# Altium schematic symbol library Sang_library.SchLib: 1607 symbols (part 6 of 15) (continued)
## EP2C35-BGA484 (continued)
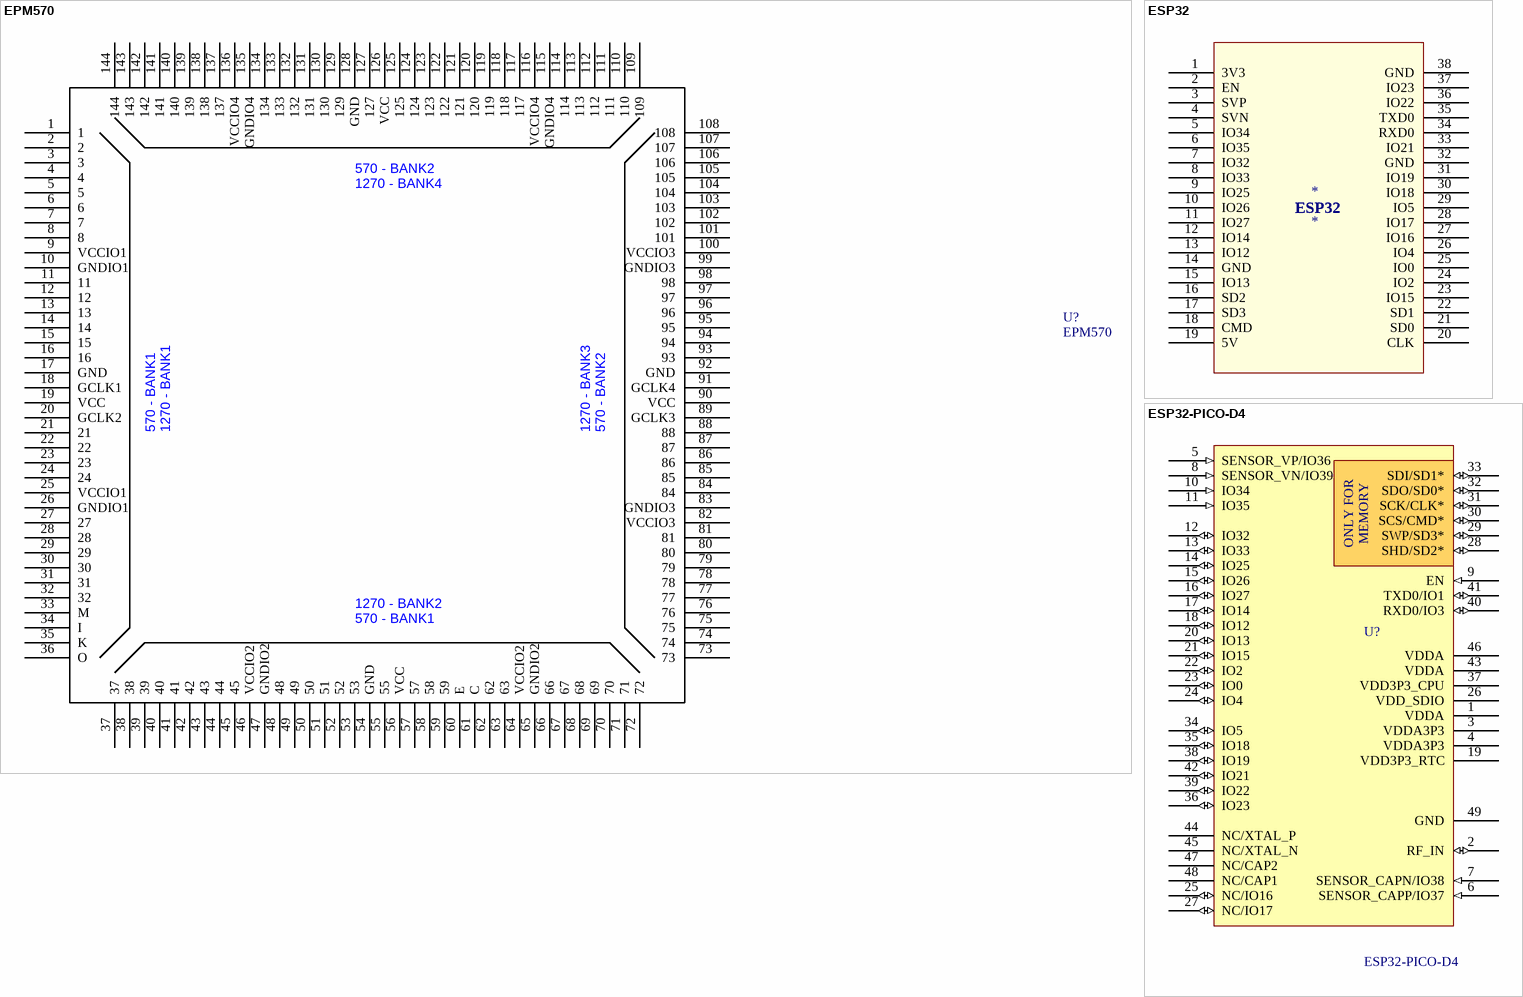
[diagram p38: symbols EPM570 to ESP32-PICO-D4]

## EPM570
designator U?
ALTERA EPLD; Manufacturer Part Number: EPM570T144C5N; Number of Logic Blocks/Elements: 570; Programmable Type: In System Programmable; Delay Time tpd(1) Max: 5.4nS; Voltage: 2.5V, 3.3V; Number of I /O: 116; Memory Type: FLASH; Number of Macrocells: 440; Supplier 1: Digi-Key; Supplier Part Number 1: 544-1320-ND; Operating Temperature: 0°C ~ 85°C; Packaging: Tray; Package / Case: 144-TQFP, 144-VQFP; RoHS: RoHS Compliant; Supplier: Digi-Key; Features: -; Supplier Part Number: 544-1320-ND; Manufacturer: Altera; Category: Integrated Circuits (ICs)
footprint TQFP144
pins: 1, 2, 3, 4, 5, 6, 7, 8, 9 VCCIO1, 10 GNDIO1, 11, 12, 13, 14, 15, 16, 17 GND, 18 GCLK1, 19 VCC, 20 GCLK2, 21, 22, 23, 24, 25 VCCIO1, 26 GNDIO1, 27, 28, 29, 30, 31, 32, 33 M, 34 I, 35 K, 36 O, 37, 38, 39, 40, 41, 42, 43, 44, 45, 46 VCCIO2, 47 GNDIO2, 48, 49, 50, 51, 52, 53, 54 GND, 55, 56 VCC, 57, 58, 59, 60 E, 61 C, 62, 63, 64 VCCIO2, 65 GNDIO2, 66, 67, 68, 69, 70, 71, 72, 73, 74, 75, 76, 77, 78, 79, 80, 81, 82 VCCIO3, 83 GNDIO3, 84, 85, 86, 87, 88, 89 GCLK3, 90 VCC, 91 GCLK4, 92 GND, 93, 94, 95, 96, 97, 98, 99 GNDIO3, 100 VCCIO3, 101, 102, 103, 104, 105, 106, 107, 108, 109, 110, 111, 112, 113, 114, 115 GNDIO4, 116 VCCIO4, 117, 118, 119, 120, 121, 122, 123, 124, 125, 126 VCC, 127, 128 GND, 129, 130, 131, 132, 133, 134, 135 GNDIO4, 136 VCCIO4, 137, 138, 139, 140, 141, 142, 143, 144
text: 570 - BANK2; 1270 - BANK4; 570 - BANK1; 1270 - BANK1; 1270 - BANK3; 1270 - BANK2

## ESP32
designator *
footprint ESP32
pins: 1 3V3, 2 EN, 3 SVP, 4 SVN, 5 IO34, 6 IO35, 7 IO32, 8 IO33, 9 IO25, 10 IO26, 11 IO27, 12 IO14, 13 IO12, 14 GND, 15 IO13, 16 SD2, 17 SD3, 18 CMD, 19 5V, 20 CLK, 21 SD0, 22 SD1, 23 IO15, 24 IO2, 25 IO0, 26 IO4, 27 IO16, 28 IO17, 29 IO5, 30 IO18, 31 IO19, 32 GND, 33 IO21, 34 RXD0, 35 TXD0, 36 IO22, 37 IO23, 38 GND

## ESP32-PICO-D4
designator U?
ESP32 WIFI BLUETOOTH; MFR: Espressif; Solder: SMT; Category: MODULE; MPN: ESP32-PICO-D4; PinCount: 48; Value: ESP32-PICO-D4
footprint ESP32-PICO-D4 (Footprint not found)
pins: 1 VDDA (power) "Power supply", 2 RF_IN (io) "Power supply", 3 VDDA3P3 (power) "Power supply", 4 VDDA3P3 (power) "Power supply", 5 SENSOR_VP/IO36 (in) "GPIO36, ADC1_CH0, RTC_GPIO0", 6 SENSOR_CAPP/IO37 (in) "GPIO39, ADC1_CH3, RTC_GPIO3", 7 SENSOR_CAPN/IO38 (in) "GPIO39, ADC1_CH3, RTC_GPIO3", 8 SENSOR_VN/IO39 (in) "GPIO39, ADC1_CH3, RTC_GPIO3", 9 EN (in) "Module-enable signal. Active high.", 10 IO34 (in) "GPIO34, ADC1_CH6, RTC_GPIO4", 11 IO35 (in) "GPIO35, ADC1_CH7, RTC_GPIO5", 12 IO32 (io) "GPIO32, XTAL_32K_P, ADC1_CH4, TOUCH9, RTC_GPIO9", 13 IO33 (io) "GPIO33, XTAL_32K_N, ADC1_CH5,TOUCH8, RTC_GPIO8", 14 IO25 (io) "GPIO25, DAC_1, ADC2_CH8, RTC_GPIO6, EMAC_RXD0", 15 IO26 (io) "GPIO26, DAC_2, ADC2_CH9, RTC_GPIO7, EMAC_RXD1", 16 IO27 (io) "GPIO27, ADC2_CH7, TOUCH7, RTC_GPIO17, EMAC_RX_DV", 17 IO14 (io) "GPIO14, ADC2_CH6, TOUCH6, RTC_GPIO16, MTMS, HSPICLK, HS2_CLK, SD_CLK, EMAC_TXD2", 18 IO12 (io) "GPIO12, ADC2_CH5, TOUCH5, RTC_GPIO15, MTDI, HSPIQ, HS2_DATA2, SD_DATA2, EMAC_TXD3", 19 VDD3P3_RTC (power) "Power supply", 20 IO13 (io) "GPIO13, ADC2_CH4, TOUCH4, RTC_GPIO14, MTCK, HSPID, HS2_DATA3,SD_DATA3, EMAC_RX_ER", 21 IO15 (io) "GPIO15, ADC2_CH3, TOUCH3, MTDO, HSPICS0, RTC_GPIO13, HS2_CMD,SD_CMD, EMAC_RXD3", 22 IO2 (io) "GPIO2, ADC2_CH2, TOUCH2, RTC_GPIO12, HSPIWP, HS2_DATA0,SD_DATA0", 23 IO0 (io) "GPIO0, ADC2_CH1, TOUCH1, RTC_GPIO11, CLK_OUT1, EMAC_TX_CLK", 24 IO4 (io) "GPIO4, ADC2_CH0, TOUCH0, RTC_GPIO10, HSPIHD, HS2_DATA1,SD_DATA1, EMAC_TX_ER", 25 NC/IO16 (io) "GPIO4, ADC2_CH0, TOUCH0, RTC_GPIO10, HSPIHD, HS2_DATA1,SD_DATA1, EMAC_TX_ER", 26 VDD_SDIO (power) "Power supply", 27 NC/IO17 (io) "GPIO16, HS1_DATA4, U2RXD, EMAC_CLK_OUT", 28 SHD/SD2* (io) "GPIO9, SD_DATA2, SPIHD, HS1_DATA2, U1RXD", 29 SWP/SD3* (io) "GPIO10, SD_DATA3, SPIWP, HS1_DATA3, U1TXD", 30 SCS/CMD* (io) "GPIO11, SD_CMD, SPICS0, HS1_CMD, U1RTS", 31 SCK/CLK* (io) "GPIO6, SD_CLK, SPICLK, HS1_CLK, U1CTS", 32 SDO/SD0* (io) "GPIO7, SD_DATA0, SPIQ, HS1_DATA0, U2RTS", 33 SDI/SD1* (io) "GPIO8, SD_DATA1, SPID, HS1_DATA1, U2CTS", 34 IO5 (io) "GPIO5, VSPICS0, HS1_DATA6, EMAC_RX_CLK", 35 IO18 (io) "GPIO18, VSPICLK, HS1_DATA7", 36 IO23 (io) "GPIO23, VSPID, HS1_STROBE", 37 VDD3P3_CPU (power) "NC", 38 IO19 (io) "GPIO19, VSPIQ, U0CTS, EMAC_TXD0", 39 IO22 (io) "GPIO22, VSPIWP, U0RTS, EMAC_TXD1", 40 RXD0/IO3 (io) "GPIO3, U0RXD, CLK_OUT2", 41 TXD0/IO1 (io) "GPIO1, U0TXD, CLK_OUT3, EMAC_RXD2", 42 IO21 (io) "GPIO21, VSPIHD, EMAC_TX_EN", 43 VDDA (power) "NC", 44 NC/XTAL_P "GPIO23, VSPID, HS1_STROBE", 45 NC/XTAL_N "GPIO23, VSPID, HS1_STROBE", 46 VDDA (power) "NC", 47 NC/CAP2 "GPIO23, VSPID, HS1_STROBE", 48 NC/CAP1 "GPIO23, VSPID, HS1_STROBE", 49 GND (power)
text: ONLY FOR; MEMORY

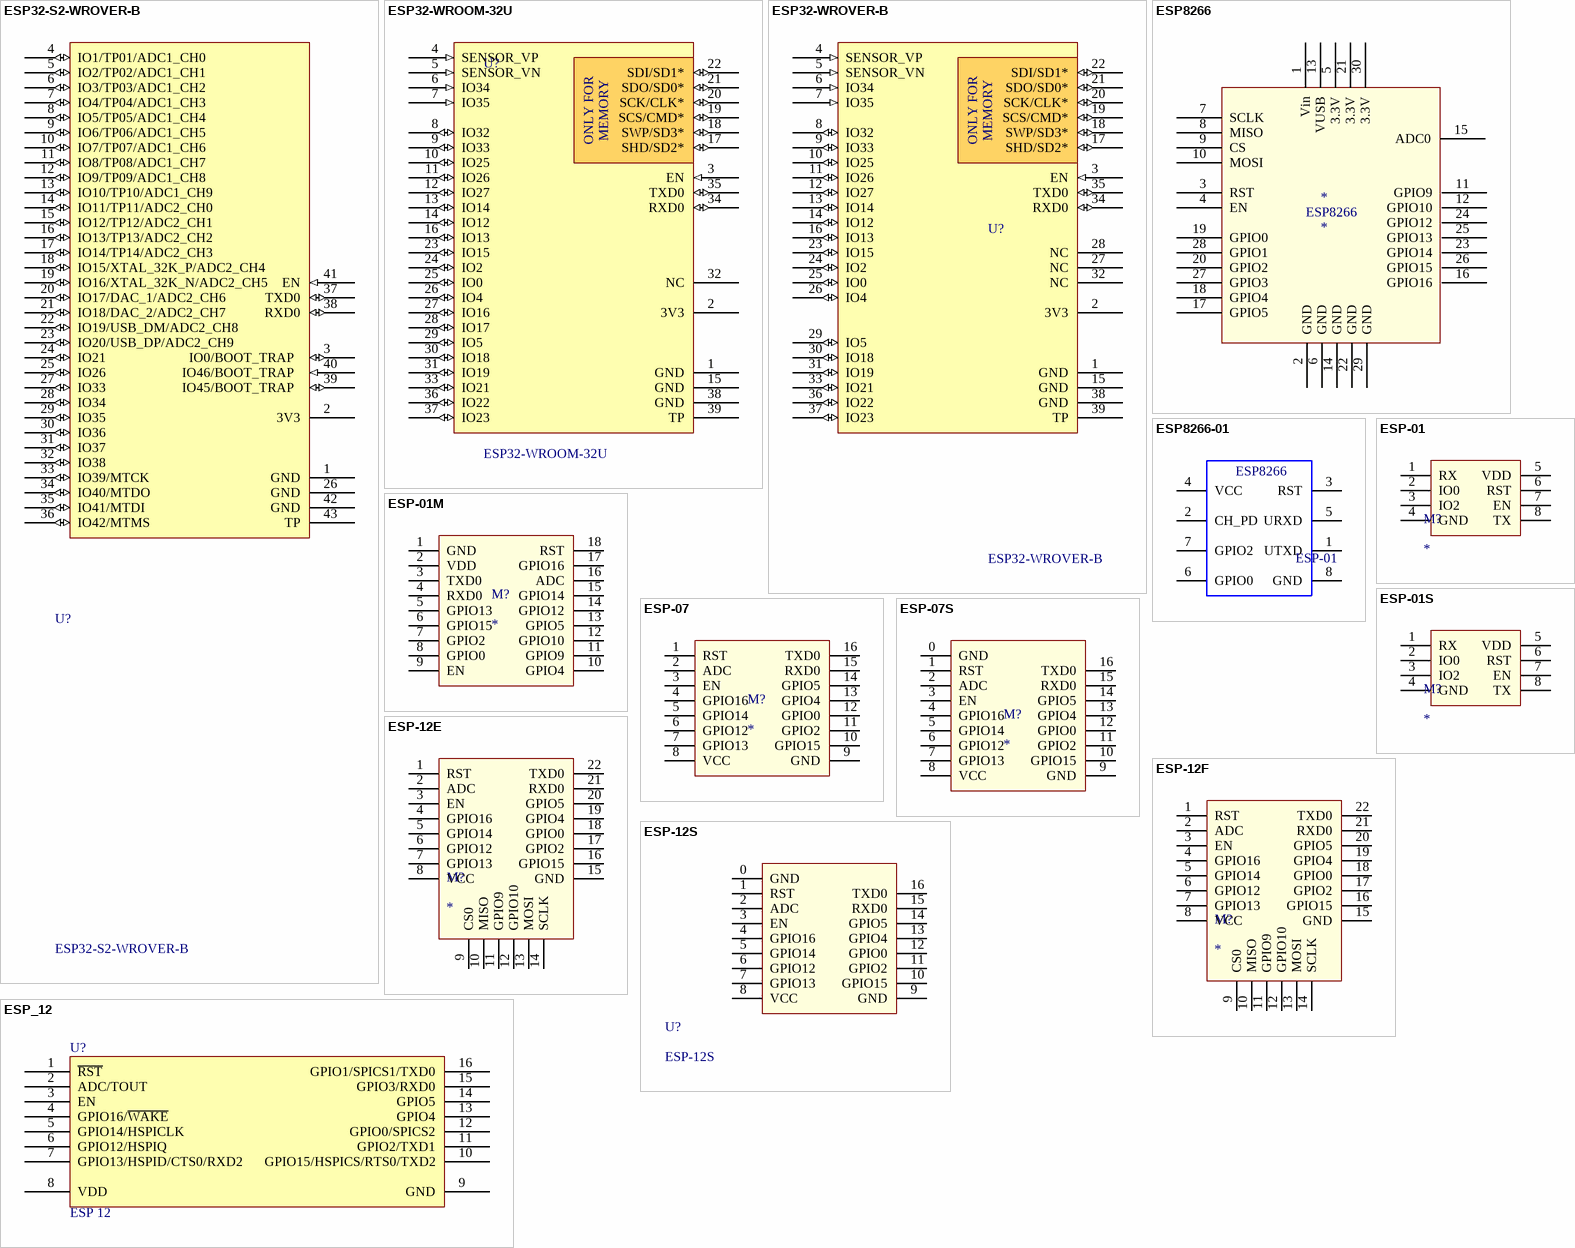
[diagram p39: symbols ESP32-S2-WROVER-B to ESP_12]

## ESP32-S2-WROVER-B
designator U?
SMD MODULE ESP32-WROVER-B, ESP32; MFR: Espressif; Solder: SMT; Category: MODULE; MPN: ESP32-S2-WROVER-B; PinCount: 43; Value: ESP32-S2-WROVER-B
footprint ESP32-S2-WROVER (Footprint not found)
pins: 1 GND (power) "Ground", 2 3V3 (power) "Power supply", 3 IO0/BOOT_TRAP   (io) "RTC_GPIO0, GPIO0", 4 IO1/TP01/ADC1_CH0   (io) "RTC_GPIO1, GPIO1, TOUCH1, ADC1_CH0", 5 IO2/TP02/ADC1_CH1   (io) "RTC_GPIO2, GPIO2, TOUCH2, ADC1_CH1", 6 IO3/TP03/ADC1_CH2   (io) "RTC_GPIO3, GPIO3, TOUCH3, ADC1_CH2", 7 IO4/TP04/ADC1_CH3   (io) "RTC_GPIO4, GPIO4, TOUCH4, ADC1_CH3", 8 IO5/TP05/ADC1_CH4   (io) "RTC_GPIO5, GPIO5, TOUCH5, ADC1_CH4", 9 IO6/TP06/ADC1_CH5 (io) "RTC_GPIO6, GPIO6, TOUCH6, ADC1_CH5", 10 IO7/TP07/ADC1_CH6   (io) "RTC_GPIO7, GPIO7, TOUCH7, ADC1_CH6", 11 IO8/TP08/ADC1_CH7   (io) "RTC_GPIO8, GPIO8, TOUCH8, ADC1_CH7", 12 IO9/TP09/ADC1_CH8   (io) "RTC_GPIO9, GPIO9, TOUCH9, ADC1_CH8, FSPIHD", 13 IO10/TP10/ADC1_CH9   (io) "RTC_GPIO10, GPIO10, TOUCH10, ADC1_CH9, FSPICS0, FSPIIO4", 14 IO11/TP11/ADC2_CH0   (io) "RTC_GPIO11, GPIO11, TOUCH11, ADC2_CH0, FSPID, FSPIIO5", 15 IO12/TP12/ADC2_CH1   (io) "RTC_GPIO12, GPIO12, TOUCH12, ADC2_CH1, FSPICLK, FSPIIO6", 16 IO13/TP13/ADC2_CH2   (io) "RTC_GPIO13, GPIO13, TOUCH13, ADC2_CH2, FSPIQ, FSPIIO7", 17 IO14/TP14/ADC2_CH3   (io) "RTC_GPIO14, GPIO14, TOUCH14, ADC2_CH3, FSPIWP, FSPIDQS", 18 IO15/XTAL_32K_P/ADC2_CH4   (io) "RTC_GPIO15, GPIO15, U0RTS, ADC2_CH4, XTAL_32K_P", 19 IO16/XTAL_32K_N/ADC2_CH5   (io) "RTC_GPIO16, GPIO16, U0CTS, ADC2_CH5, XTAL_32K_N", 20 IO17/DAC_1/ADC2_CH6   (io) "RTC_GPIO17, GPIO17, U1TXD, ADC2_CH6, DAC_1", 21 IO18/DAC_2/ADC2_CH7   (io) "RTC_GPIO18, GPIO18, U1RXD, ADC2_CH7, DAC_2, CLK_OUT3", 22 IO19/USB_DM/ADC2_CH8   (io) "RTC_GPIO19, GPIO19, U1RTS, ADC2_CH8, CLK_OUT2, USB_D", 23 IO20/USB_DP/ADC2_CH9   (io) "RTC_GPIO20, GPIO20, U1CTS, ADC2_CH9, CLK_OUT1, USB_D+", 24 IO21   (io) "RTC_GPIO21, GPIO21", 25 IO26 (io) "SPICS1, GPIO26", 26 GND (power) "Ground", 27 IO33 (io) "SPIIO4, GPIO33, FSPIHD", 28 IO34 (io) "SPIIO5, GPIO34, FSPICS0", 29 IO35 (io) "SPIIO6, GPIO35, FSPID", 30 IO36 (io) "SPIIO7, GPIO36, FSPICLK", 31 IO37 (io) "SPIDQS, GPIO37, FSPIQ", 32 IO38 (io) "GPIO38, FSPIWP", 33 IO39/MTCK   (io) "MTCK, GPIO39, CLK_OUT3", 34 IO40/MTDO   (io) "MTDO, GPIO40, CLK_OUT2", 35 IO41/MTDI   (io) "MTDI, GPIO41, CLK_OUT1", 36 IO42/MTMS   (io) "MTMS, GPIO42", 37 TXD0 (io) "GPIO1, U0TXD, CLK_OUT3, EMAC_RXD2", 38 RXD0 (io) "GPIO3, U0RXD, CLK_OUT2", 39 IO45/BOOT_TRAP   (io) "GPIO45, BOOT_TRAP", 40 IO46/BOOT_TRAP   (in) "GPIO46, BOOT_TRAP", 41 EN (in) "Module-enable signal. Active high.", 42 GND (power) "Ground", 43 TP (power)

## ESP32-WROOM-32U
designator U?
Wi-Fi/BT BLE Module ESP32-D0WD; MFR: Espressif; Solder: SMT; Price: None; Value: ESP32-WROOM-32U; Category: MODULE; MPN: ESP32-WROOM-32U; PinCount: 40
footprint ESP32-WROOM-32U (Footprint not found)
pins: 1 GND (power) "Ground", 2 3V3 (power) "Power supply", 3 EN (in) "Module-enable signal. Active high.", 4 SENSOR_VP (in) "GPIO36, ADC1_CH0, RTC_GPIO0", 5 SENSOR_VN (in) "GPIO39, ADC1_CH3, RTC_GPIO3", 6 IO34 (in) "GPIO34, ADC1_CH6, RTC_GPIO4", 7 IO35 (in) "GPIO35, ADC1_CH7, RTC_GPIO5", 8 IO32 (io) "GPIO32, XTAL_32K_P, ADC1_CH4, TOUCH9, RTC_GPIO9", 9 IO33 (io) "GPIO33, XTAL_32K_N, ADC1_CH5,TOUCH8, RTC_GPIO8", 10 IO25 (io) "GPIO25, DAC_1, ADC2_CH8, RTC_GPIO6, EMAC_RXD0", 11 IO26 (io) "GPIO26, DAC_2, ADC2_CH9, RTC_GPIO7, EMAC_RXD1", 12 IO27 (io) "GPIO27, ADC2_CH7, TOUCH7, RTC_GPIO17, EMAC_RX_DV", 13 IO14 (io) "GPIO14, ADC2_CH6, TOUCH6, RTC_GPIO16, MTMS, HSPICLK, HS2_CLK, SD_CLK, EMAC_TXD2", 14 IO12 (io) "GPIO12, ADC2_CH5, TOUCH5, RTC_GPIO15, MTDI, HSPIQ, HS2_DATA2, SD_DATA2, EMAC_TXD3", 15 GND (power) "Ground", 16 IO13 (io) "GPIO13, ADC2_CH4, TOUCH4, RTC_GPIO14, MTCK, HSPID, HS2_DATA3,SD_DATA3, EMAC_RX_ER", 17 SHD/SD2* (io) "GPIO9, SD_DATA2, SPIHD, HS1_DATA2, U1RXD", 18 SWP/SD3* (io) "GPIO10, SD_DATA3, SPIWP, HS1_DATA3, U1TXD", 19 SCS/CMD* (io) "GPIO11, SD_CMD, SPICS0, HS1_CMD, U1RTS", 20 SCK/CLK* (io) "GPIO6, SD_CLK, SPICLK, HS1_CLK, U1CTS", 21 SDO/SD0* (io) "GPIO7, SD_DATA0, SPIQ, HS1_DATA0, U2RTS", 22 SDI/SD1* (io) "GPIO8, SD_DATA1, SPID, HS1_DATA1, U2CTS", 23 IO15 (io) "GPIO15, ADC2_CH3, TOUCH3, MTDO, HSPICS0, RTC_GPIO13, HS2_CMD,SD_CMD, EMAC_RXD3", 24 IO2 (io) "GPIO2, ADC2_CH2, TOUCH2, RTC_GPIO12, HSPIWP, HS2_DATA0,SD_DATA0", 25 IO0 (io) "GPIO0, ADC2_CH1, TOUCH1, RTC_GPIO11, CLK_OUT1, EMAC_TX_CLK", 26 IO4 (io) "GPIO4, ADC2_CH0, TOUCH0, RTC_GPIO10, HSPIHD, HS2_DATA1,SD_DATA1, EMAC_TX_ER", 27 IO16 (io) "GPIO16, HS1_DATA4, U2RXD, EMAC_CLK_OUT", 28 IO17 (io) "GPIO17, HS1_DATA5, U2TXD, EMAC_CLK_OUT_180", 29 IO5 (io) "GPIO5, VSPICS0, HS1_DATA6, EMAC_RX_CLK", 30 IO18 (io) "GPIO18, VSPICLK, HS1_DATA7", 31 IO19 (io) "GPIO19, VSPIQ, U0CTS, EMAC_TXD0", 32 NC, 33 IO21 (io) "GPIO21, VSPIHD, EMAC_TX_EN", 34 RXD0 (io) "GPIO3, U0RXD, CLK_OUT2", 35 TXD0 (io) "GPIO1, U0TXD, CLK_OUT3, EMAC_RXD2", 36 IO22 (io) "GPIO22, VSPIWP, U0RTS, EMAC_TXD1", 37 IO23 (io) "GPIO23, VSPID, HS1_STROBE", 38 GND (power) "Ground", 39 TP (power)
text: ONLY FOR; MEMORY

## ESP32-WROVER-B
designator U?
SMD MODULE ESP32-WROVER-B, ESP32; MFR: Espressif; Solder: SMT; Category: MODULE; MPN: ESP32-WROVER-B; PinCount: 39; Value: ESP32-WROVER-B
footprint ESP32-WROVER
pins: 1 GND (power) "Ground", 2 3V3 (power) "Power supply", 3 EN (in) "Module-enable signal. Active high.", 4 SENSOR_VP (in) "GPIO36, ADC1_CH0, RTC_GPIO0", 5 SENSOR_VN (in) "GPIO39, ADC1_CH3, RTC_GPIO3", 6 IO34 (in) "GPIO34, ADC1_CH6, RTC_GPIO4", 7 IO35 (in) "GPIO35, ADC1_CH7, RTC_GPIO5", 8 IO32 (io) "GPIO32, XTAL_32K_P, ADC1_CH4, TOUCH9, RTC_GPIO9", 9 IO33 (io) "GPIO33, XTAL_32K_N, ADC1_CH5,TOUCH8, RTC_GPIO8", 10 IO25 (io) "GPIO25, DAC_1, ADC2_CH8, RTC_GPIO6, EMAC_RXD0", 11 IO26 (io) "GPIO26, DAC_2, ADC2_CH9, RTC_GPIO7, EMAC_RXD1", 12 IO27 (io) "GPIO27, ADC2_CH7, TOUCH7, RTC_GPIO17, EMAC_RX_DV", 13 IO14 (io) "GPIO14, ADC2_CH6, TOUCH6, RTC_GPIO16, MTMS, HSPICLK, HS2_CLK, SD_CLK, EMAC_TXD2", 14 IO12 (io) "GPIO12, ADC2_CH5, TOUCH5, RTC_GPIO15, MTDI, HSPIQ, HS2_DATA2, SD_DATA2, EMAC_TXD3", 15 GND (power) "Ground", 16 IO13 (io) "GPIO13, ADC2_CH4, TOUCH4, RTC_GPIO14, MTCK, HSPID, HS2_DATA3,SD_DATA3, EMAC_RX_ER", 17 SHD/SD2* (io) "GPIO9, SD_DATA2, SPIHD, HS1_DATA2, U1RXD", 18 SWP/SD3* (io) "GPIO10, SD_DATA3, SPIWP, HS1_DATA3, U1TXD", 19 SCS/CMD* (io) "GPIO11, SD_CMD, SPICS0, HS1_CMD, U1RTS", 20 SCK/CLK* (io) "GPIO6, SD_CLK, SPICLK, HS1_CLK, U1CTS", 21 SDO/SD0* (io) "GPIO7, SD_DATA0, SPIQ, HS1_DATA0, U2RTS", 22 SDI/SD1* (io) "GPIO8, SD_DATA1, SPID, HS1_DATA1, U2CTS", 23 IO15 (io) "GPIO15, ADC2_CH3, TOUCH3, MTDO, HSPICS0, RTC_GPIO13, HS2_CMD,SD_CMD, EMAC_RXD3", 24 IO2 (io) "GPIO2, ADC2_CH2, TOUCH2, RTC_GPIO12, HSPIWP, HS2_DATA0,SD_DATA0", 25 IO0 (io) "GPIO0, ADC2_CH1, TOUCH1, RTC_GPIO11, CLK_OUT1, EMAC_TX_CLK", 26 IO4 (io) "GPIO4, ADC2_CH0, TOUCH0, RTC_GPIO10, HSPIHD, HS2_DATA1,SD_DATA1, EMAC_TX_ER", 27 NC "GPIO16, HS1_DATA4, U2RXD, EMAC_CLK_OUT", 28 NC "GPIO17, HS1_DATA5, U2TXD, EMAC_CLK_OUT_180", 29 IO5 (io) "GPIO5, VSPICS0, HS1_DATA6, EMAC_RX_CLK", 30 IO18 (io) "GPIO18, VSPICLK, HS1_DATA7", 31 IO19 (io) "GPIO19, VSPIQ, U0CTS, EMAC_TXD0", 32 NC, 33 IO21 (io) "GPIO21, VSPIHD, EMAC_TX_EN", 34 RXD0 (io) "GPIO3, U0RXD, CLK_OUT2", 35 TXD0 (io) "GPIO1, U0TXD, CLK_OUT3, EMAC_RXD2", 36 IO22 (io) "GPIO22, VSPIWP, U0RTS, EMAC_TXD1", 37 IO23 (io) "GPIO23, VSPID, HS1_STROBE", 38 GND (power) "Ground", 39 TP (power)
text: ONLY FOR; MEMORY

## ESP8266
designator *
footprint ESP8266_Big
footprint ESP8266_Small (NodeMCU)
pins: 1 Vin, 2 GND, 3 RST, 4 EN, 5 3.3V, 6 GND, 7 SCLK, 8 MISO, 9 CS, 10 MOSI, 11 GPIO9, 12 GPIO10, 13 VUSB, 14 GND, 15 ADC0, 16 GPIO16, 17 GPIO5, 18 GPIO4, 19 GPIO0, 20 GPIO2, 21 3.3V, 22 GND, 23 GPIO14, 24 GPIO12, 25 GPIO13, 26 GPIO15, 27 GPIO3, 28 GPIO1, 29 GND, 30 3.3V

## ESP8266-01
designator U?, comment ESP-01
ESP-12 Wi-Fi Module
footprint ESP8266
footprint JP4-C2T (8 pins, dual row, straight, gold plating)
pins: 1 UTXD, 2 CH_PD, 3 RST, 4 VCC, 5 URXD, 6 GPIO0, 7 GPIO2, 8 GND
text: ESP8266

## ESP-01
designator M?
MFR: Espressif; MPN: ESP-01; Solder: WAVE; Value: ESP-01; Category: MODULE; PinCount: 8
footprint ESP-01&01S Module
pins: 1 RX, 2 IO0, 3 IO2, 4 GND, 5 VDD, 6 RST, 7 EN, 8 TX

## ESP-01M
designator M?
MFR: Espressif; MPN: ESP-01M; Solder: SMT; Value: ESP-01M; Category: MODULE; PinCount: 18
footprint ESP-01M
pins: 1 GND, 2 VDD, 3 TXD0, 4 RXD0, 5 GPIO13, 6 GPIO15, 7 GPIO2, 8 GPIO0, 9 EN, 10 GPIO4, 11 GPIO9, 12 GPIO10, 13 GPIO5, 14 GPIO12, 15 GPIO14, 16 ADC, 17 GPIO16, 18 RST

## ESP-01S
designator M?
MFR: Espressif; MPN: ESP-01S; Solder: WAVE; Value: ESP-01S; Category: MODULE; PinCount: 8
footprint ESP-01&01S Module
pins: 1 RX, 2 IO0, 3 IO2, 4 GND, 5 VDD, 6 RST, 7 EN, 8 TX

## ESP-07
designator M?
ESP-07 Module; MFR: Espressif; Solder: SMT; Category: MODULE; MPN: ESP-07; PinCount: 16; Value: ESP-07
footprint ESP-07 Module
pins: 1 RST, 2 ADC, 3 EN, 4 GPIO16, 5 GPIO14, 6 GPIO12, 7 GPIO13, 8 VCC, 9 GND, 10 GPIO15, 11 GPIO2, 12 GPIO0, 13 GPIO4, 14 GPIO5, 15 RXD0, 16 TXD0

## ESP-07S
designator M?
ESP-07S Module; MFR: Espressif; Solder: SMT; Category: MODULE; MPN: ESP-07S; PinCount: 16; Value: ESP-07S
footprint ESP-07S Module
pins: 0 GND, 1 RST, 2 ADC, 3 EN, 4 GPIO16, 5 GPIO14, 6 GPIO12, 7 GPIO13, 8 VCC, 9 GND, 10 GPIO15, 11 GPIO2, 12 GPIO0, 13 GPIO4, 14 GPIO5, 15 RXD0, 16 TXD0

## ESP-12E
designator M?
ESP-12E Module; MFR: Espressif; Solder: SMT; Category: MODULE; MPN: ESP-12E; PinCount: 22; Value: ESP-12E
footprint ESP-12E&F Module
pins: 1 RST, 2 ADC, 3 EN, 4 GPIO16, 5 GPIO14, 6 GPIO12, 7 GPIO13, 8 VCC, 9 CS0, 10 MISO, 11 GPIO9, 12 GPIO10, 13 MOSI, 14 SCLK, 15 GND, 16 GPIO15, 17 GPIO2, 18 GPIO0, 19 GPIO4, 20 GPIO5, 21 RXD0, 22 TXD0

## ESP-12F
designator M?
ESP-12F Module; MFR: Espressif; Solder: SMT; Category: MODULE; MPN: ESP-12F; PinCount: 22; Value: ESP-12F
footprint ESP-12E&F Module
pins: 1 RST, 2 ADC, 3 EN, 4 GPIO16, 5 GPIO14, 6 GPIO12, 7 GPIO13, 8 VCC, 9 CS0, 10 MISO, 11 GPIO9, 12 GPIO10, 13 MOSI, 14 SCLK, 15 GND, 16 GPIO15, 17 GPIO2, 18 GPIO0, 19 GPIO4, 20 GPIO5, 21 RXD0, 22 TXD0

## ESP-12S
designator U?
ESP-12S Module; MFR: Espressif; Solder: SMT; Category: MODULE; MPN: ESP-12S; PinCount: 16; Value: ESP-12S
footprint ESP-12S Module
pins: 0 GND, 1 RST, 2 ADC, 3 EN, 4 GPIO16, 5 GPIO14, 6 GPIO12, 7 GPIO13, 8 VCC, 9 GND, 10 GPIO15, 11 GPIO2, 12 GPIO0, 13 GPIO4, 14 GPIO5, 15 RXD0, 16 TXD0

## ESP_12
designator U?, comment ESP 12
ESP-12 Wi-Fi Module by AI-Thinker; IC: ESP8266-EX; Vendor: Ai-thinker
footprint ESP12
footprint ESP12_small
pins: 1 ~{RST} "Reset", 2 ADC/TOUT "ADC Input Or TOUT Output", 3 EN "Chip enable", 4 GPIO16/~{WAKE} "GPIO16 or Deep-Sleep Wakeup", 5 GPIO14/HSPICLK "GPIO14 or SPI CLK", 6 GPIO12/HSPIQ "GPIO12 or SPIQ", 7 GPIO13/HSPID/CTS0/RXD2 "GPIO13 or SPID", 8 VDD "Power supply", 9 GND "Power ground", 10 GPIO15/HSPICS/RTS0/TXD2 "GPIO15 or SPICS", 11 GPIO2/TXD1 "GPIO2 or TX", 12 GPIO0/SPICS2 "GPIO0 or SPICS2", 13 GPIO4 "GPIO5", 14 GPIO5 "GPIO4", 15 GPIO3/RXD0 "GPIO3 or UART RXD", 16 GPIO1/SPICS1/TXD0 "GPIO1 or UART TXD"

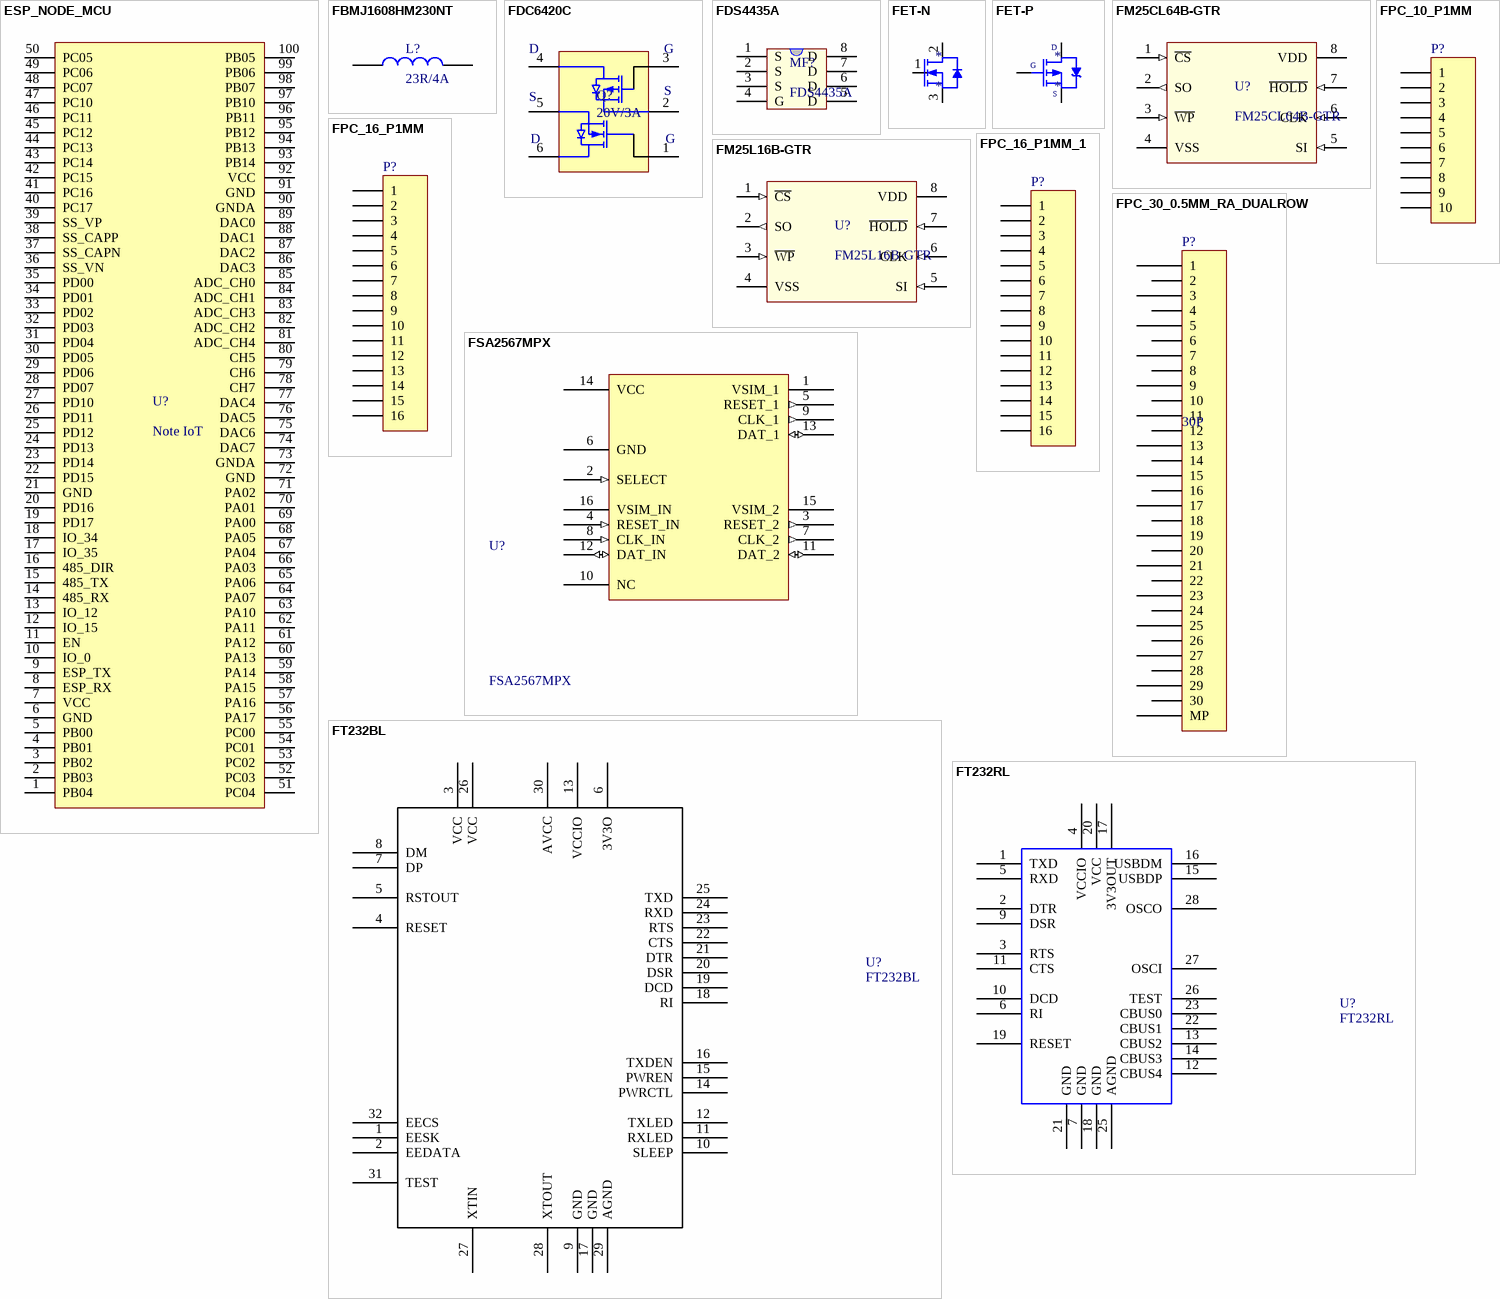
[diagram p40: symbols ESP_NODE_MCU to FT232RL]

## ESP_NODE_MCU
designator U?, comment Note IoT
PINOUT FOR NODE IOT; Project: TPA_IoT; Designer: Butpt; Value: Note IoT
footprint NODE_IOT
pins: 1 PB04, 2 PB03, 3 PB02, 4 PB01, 5 PB00, 6 GND, 7 VCC, 8 ESP_RX, 9 ESP_TX, 10 IO_0, 11 EN, 12 IO_15, 13 IO_12, 14 485_RX, 15 485_TX, 16 485_DIR, 17 IO_35, 18 IO_34, 19 PD17, 20 PD16, 21 GND, 22 PD15, 23 PD14, 24 PD13, 25 PD12, 26 PD11, 27 PD10, 28 PD07, 29 PD06, 30 PD05, 31 PD04, 32 PD03, 33 PD02, 34 PD01, 35 PD00, 36 SS_VN, 37 SS_CAPN, 38 SS_CAPP, 39 SS_VP, 40 PC17, 41 PC16, 42 PC15, 43 PC14, 44 PC13, 45 PC12, 46 PC11, 47 PC10, 48 PC07, 49 PC06, 50 PC05, 51 PC04, 52 PC03, 53 PC02, 54 PC01, 55 PC00, 56 PA17, 57 PA16, 58 PA15, 59 PA14, 60 PA13, 61 PA12, 62 PA11, 63 PA10, 64 PA07, 65 PA06, 66 PA03, 67 PA04, 68 PA05, 69 PA00, 70 PA01, 71 PA02, 72 GND, 73 GNDA, 74 DAC7, 75 DAC6, 76 DAC5, 77 DAC4, 78 CH7, 79 CH6, 80 CH5, 81 ADC_CH4, 82 ADC_CH2, 83 ADC_CH3, 84 ADC_CH1, 85 ADC_CH0, 86 DAC3, 87 DAC2, 88 DAC1, 89 DAC0, 90 GNDA, 91 GND, 92 VCC, 93 PB14, 94 PB13, 95 PB12, 96 PB11, 97 PB10, 98 PB07, 99 PB06, 100 PB05

## FBMJ1608HM230NT
designator L?, comment 23R/4A
IND-FERRITE BEAD 23 OHM  4A 0603 1LN; MPN: FBMJ1608HM230NT; CompanyID: VT-01060; Solder: SMT; Value: 23R/4A; Category: FERRITE BEAD; PinCount: 2
footprint IND-0603 (1608) (Resistor, Chip; 1.60 mm L X 0.80 mm W X 0.50 mm H body)
pins: 1, 2

## FDC6420C
designator Q?, comment 20V/3A
MOSFET N/P-CH 20V 3A/2.2A SSOT-6; MPN: FDC6420C; CompanyID: VT-00922; Solder: SMT; Value: 20V/3A
footprint SOT23-6 (SOT23, 6-Leads, Body 3.03x2.84mm, Pitch 0.95mm, IPC Medium Density)
pins: 1, 2, 3, 4, 5, 6
text: D; G; S

## FDS4435A
designator MF?
P-Channel Logic Level PowerTrench MOSFET; Value: FDS4435
footprint SO8
footprint DIP8
pins: 1 S, 2 S, 3 S, 4 G, 5 D, 6 D, 7 D, 8 D

## FET-N
designator *
footprint TO_252
pins: 1 G, 2 D, 3 S

## FET-P
designator *
pins: 1 G, 2 D, 3 S

## FM25CL64B-GTR
designator U?
IC FRAM 64KBIT 20MHz SOIC-8; Solder: SMT; MPN: FM25CL64B-GTR; Value: FM25CL64B-GTR; Category: IC; PinCount: 8
footprint SOIC-8
pins: 1 ~{CS} (in), 2 SO (out), 3 ~{WP} (in), 4 VSS (power), 5 SI (in), 6 CLK (in), 7 ~{HOLD} (in), 8 VDD (power)

## FM25L16B-GTR
designator U?
IC FRAM 16KBIT 20MHz SOIC-8; Solder: SMT; MPN: FM25L16B-GTR; Value: FM25L16B-GTR; Category: IC; PinCount: 8
footprint SOIC-8
pins: 1 ~{CS} (in), 2 SO (out), 3 ~{WP} (in), 4 VSS (power), 5 SI (in), 6 CLK (in), 7 ~{HOLD} (in), 8 VDD (power)

## FPC_10_P1MM
designator P?
Header, 10-Pin; Solder: SMT
footprint FPC_10_P1MM (Footprint not found)
pins: 1, 2, 3, 4, 5, 6, 7, 8, 9, 10

## FPC_16_P1MM
designator P?
Header, 16-Pin; Solder: SMT
footprint FPC_16_P1MM (Footprint not found)
pins: 1, 2, 3, 4, 5, 6, 7, 8, 9, 10, 11, 12, 13, 14, 15, 16

## FPC_16_P1MM_1
designator P?
Header, 16-Pin; Solder: SMT
footprint FPC_16_P1MM (Footprint not found)
pins: 1, 2, 3, 4, 5, 6, 7, 8, 9, 10, 11, 12, 13, 14, 15, 16

## FPC_30_0.5MM_RA_DUALROW
designator P?, comment 30P
FPC_30_0.5MM_RA_DUALROW; MFR: AISU; Solder: SMT; MFR_URL: https://detail.tmall.com/item.htm?id=580113708551&rn=8ff0bf25cc32f12d0ad2de94d2fc9809&abbucket=6&skuId=3867202437827; Value: 30P
footprint FPC_30_0.5MM_RA_DUALROW_HAND
footprint FPC_30_0.5MM_RA_DUALROW_SMT
pins: 0 MP, 1, 2, 3, 4, 5, 6, 7, 8, 9, 10, 11, 12, 13, 14, 15, 16, 17, 18, 19, 20, 21, 22, 23, 24, 25, 26, 27, 28, 29, 30

## FSA2567MPX
designator U?
IC SWITCH 4PDT 16MLP; MFR: ON Semiconductor; Solder: SMT; MPN: FSA2567MPX; Value: FSA2567MPX; Category: IC; PinCount: 16
footprint QFN16 30X30 (QFN, 16-Leads, Body 3.00x3.00mm, Pitch 0.50mm, Thermal Pad 1.70x1.70mm, IPC Medium Density)
pins: 1 VSIM_1 (power), 2 SELECT (in), 3 RESET_2 (out), 4 RESET_IN (in), 5 RESET_1 (out), 6 GND (power), 7 CLK_2 (out), 8 CLK_IN (in), 9 CLK_1 (out), 10 NC (hiz), 11 DAT_2 (io), 12 DAT_IN (io), 13 DAT_1 (io), 14 VCC (power), 15 VSIM_2 (power), 16 VSIM_IN (power)

## FT232BL
designator U?
USB TO UART INTERFACE; Manufacturer Part Number: FT232BL R; Manufacturer: FTDI, Future Technology Devices International Ltd; Voltage: 4.35 V ~ 5.25 V; FIFO's: 256 Byte; Number of Channels: 8; Supplier 1: Digi-Key; Supplier Part Number 1: 768-1009-1-ND; Supplier: Digi-Key; Features: Serial Interface; Packaging: Cut Tape (CT); Package / Case: 32-LQFP; Supplier Part Number: 768-1009-1-ND; Category: Integrated Circuits (ICs); RoHS: RoHS Compliant
footprint TQFP32 (Thin QFP, 32-Leads, Body 9x9mm, Pitch 0.8mm, IPC Low Density)
pins: 1 EESK, 2 EEDATA, 3 VCC, 4 RESET, 5 RSTOUT, 6 3V3O, 7 DP, 8 DM, 9 GND, 10 SLEEP, 11 RXLED, 12 TXLED, 13 VCCIO, 14 PWRCTL, 15 PWREN, 16 TXDEN, 17 GND, 18 RI, 19 DCD, 20 DSR, 21 DTR, 22 CTS, 23 RTS, 24 RXD, 25 TXD, 26 VCC, 27 XTIN, 28 XTOUT, 29 AGND, 30 AVCC, 31 TEST, 32 EECS

## FT232RL
designator U?
USB TO UART INTERFACE; Manufacturer: FTDI, Future Technology Devices International Ltd; Manufacturer Part Number: FT232RL R; Number of Channels: 8; Voltage: 3.3 V ~ 5.25 V; FIFO's: 256 Byte; Supplier 1: Digi-Key; Supplier Part Number 1: 768-1007-2-ND; RoHS: RoHS Compliant; Features: Serial Interface; Package / Case: 28-SSOP; Supplier: Digi-Key; Packaging: Tape & Reel (TR); Supplier Part Number: 768-1007-2-ND; Category: Integrated Circuits (ICs)
footprint TSSOP28
pins: 1 TXD, 2 DTR, 3 RTS, 4 VCCIO, 5 RXD, 6 RI, 7 GND, 9 DSR, 10 DCD, 11 CTS, 12 CBUS4, 13 CBUS2, 14 CBUS3, 15 USBDP, 16 USBDM, 17 3V3OUT, 18 GND, 19 RESET, 20 VCC, 21 GND, 22 CBUS1, 23 CBUS0, 25 AGND, 26 TEST, 27 OSCI, 28 OSCO
